# Altium footprint library MH_DA_THU_VIEN_16122016.PcbLib: 531 footprints (part 7 of 34)
Each footprint in its own frame and in the unit in brackets; x right, y up, seen from the top. Pads: shape width x height; smd on the part's side, far side on the other; paste and mask are expansions set on the pad; w line width, h text height; cw(c..) or ccw(c..) is an arc to the next point about the centre after c.
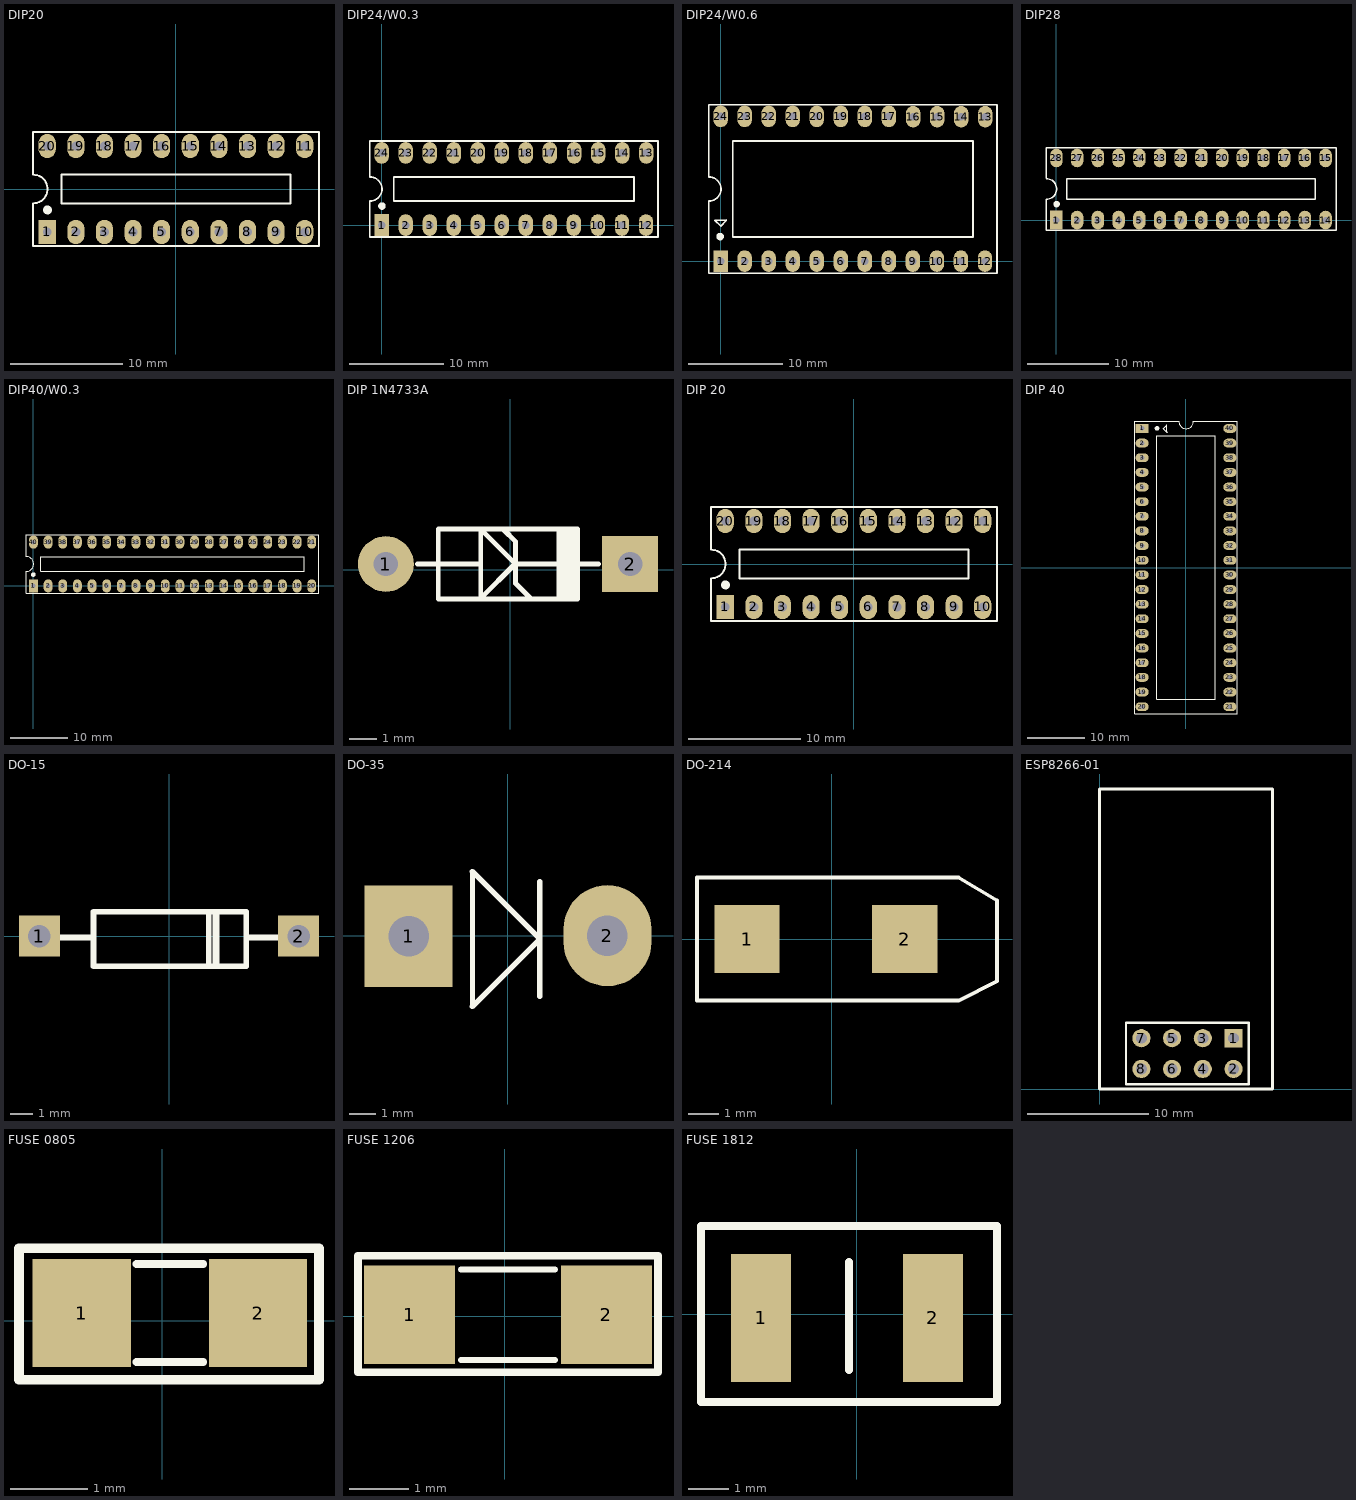
[diagram p6: the footprints below, top view; thin cyan lines are the x and y axes]

## DIP20 [mil]
pads (20):
  rect 60x85 hole 31: 1(-450,-149)
  oval 60x85 hole 31: 2(-350,-149) 3(-250,-149) 4(-150,-149) 5(-50,-149) 6(50,-149) 7(150,-149) 8(250,-149) 9(350,-149) 10(450,-149) 11(450,151) 12(350,151) 13(250,151) 14(150,151) 15(50,151) 16(-50,151) 17(-150,151) 18(-250,151) 19(-350,151) 20(-450,151)
Top Overlay:
  circle w15: c-449,-72 r8
  lines w7: -500.38,-48.95 ccw(c-498.69,1.02) -500,51 ; -500,-49 -500,-199 500,-199 500,201 -500,201 -500,52 ; -400,-49 400,-49 400,51 -400,51 -400,-49
3D body: height 155, standoff -130, extent -541,-167 495,173

## DIP24/W0.3 [mil] "DIP24/W.300, Pin to pin 100mil"
height 100
pads (24):
  rect 60x90 hole 31: 1(0,0)
  oval 60x90 hole 31: 2(100,0) 3(200,0) 4(300,0) 5(400,0) 6(500,0) 7(600,0) 8(700,0) 9(800,0) 10(900,0) 11(1000,0) 12(1100,0) 13(1101,300) 14(1001,300) 15(901,300) 16(801,300) 17(700,300) 18(600,300) 19(500,300) 20(400,300) 21(300,300) 22(200,300) 23(100,300) 24(0,300)
Top Overlay:
  circle w15: c1,79 r8
  lines w7: -50.38,100.05 ccw(c-48.69,150.02) -50,200 ; -50,100 -50,-50 1150,-50 1150,350 -50,350 -50,201 ; 50,100 50,200 1050,200 1050,100 50,100
3D body: height 200, standoff -98.03, extent -89.04,-2.92 1181.04,306.92

## DIP24/W0.6 [mil] "DIP24/W.600, Pin to pin 100mil"
height 100
pads (24):
  rect 60x90 hole 31: 1(0,0)
  oval 60x90 hole 31: 2(100,0) 3(200,0) 4(300,0) 5(400,0) 6(500,0) 7(600,0) 8(700,0) 9(800,0) 10(900,0) 11(1000,0) 12(1100,0) 13(1101,601) 14(1001,601) 15(901,601) 16(801,601) 17(700,602) 18(600,602) 19(500,602) 20(400,602) 21(300,602) 22(200,602) 23(100,602) 24(0,602)
Top Overlay:
  circle w15: c-2,102 r8
  lines w7: -50,350 -50,650 1150,650 1150,-50 -50,-50 -50,250 ccw(c-48.31,299.97) -49.62,349.95 ; -25,170 23,170 24,171 24,169 0,145 0,146 -24,170 -25,170 ; 50,100 50,500 1050,500 1050,100 50,100
3D body: height 227.95, standoff -129.92, extent -82.52,0.16 1202.52,600

## DIP28 [mil] "28 PIN, W 300mil, Pin to pin 100mil"
height 100
pads (28):
  rect 60x90 hole 31: 1(0,0)
  oval 60x90 hole 31: 2(100,0) 3(200,0) 4(300,0) 5(400,0) 6(500,0) 7(600,0) 8(700,0) 9(800,0) 10(900,0) 11(1000,0) 12(1100,0) 13(1200,0) 14(1300,0) 15(1300,300) 16(1200,300) 17(1100,300) 18(1000,300) 19(900,300) 20(800,300) 21(700,300) 22(600,300) 23(500,300) 24(400,300) 25(300,300) 26(200,300) 27(100,300) 28(0,300)
Top Overlay:
  circle w15: c1,77 r8
  lines w7: -50.38,100.05 ccw(c-48.69,150.02) -50,200 ; -50,100 -50,-50 1350,-50 1350,350 -50,350 -50,201 ; 50,100 50,200 1250,200 1250,100 50,100
3D body: height 200, standoff -98.03, extent -50,-10 1367.32,299.84

## DIP40/W0.3 [mil] "40 PIN, W 300mil, Pin to pin 100mil"
height 100
pads (40):
  rect 60x90 hole 31: 1(0,0)
  oval 60x90 hole 31: 2(100,0) 3(200,0) 4(300,0) 5(400,0) 6(500,0) 7(600,0) 8(700,0) 9(800,0) 10(900,0) 11(1000,0) 12(1100,0) 13(1200,0) 14(1300,0) 15(1400,0) 16(1500,0) 17(1600,0) 18(1700,0) 19(1800,0) 20(1900,0) 21(1900,300) 22(1800,300) 23(1700,300) 24(1600,300) 25(1500,300) 26(1400,300) 27(1300,300) 28(1200,300) 29(1100,300) 30(1000,300) 31(900,300) 32(800,300) 33(700,300) 34(600,300) 35(500,300) 36(400,300) 37(300,300) 38(200,300) 39(100,300) 40(0,300)
Top Overlay:
  circle w15: c-1,78 r8
  lines w7: -50.38,100.05 ccw(c-48.69,150.02) -50,200 ; -50,100 -50,-50 1950,-50 1950,350 -50,350 -50,201 ; 50,100 1850,100 1850,200 50,200 50,100
3D body: height 227.95, standoff -129.92, extent -70,-160.91 2000.87,440.91

## DIP 1N4733A [mil]
pads (2):
  round 80 hole 35: 1(-178.07,8.11)
  rect 80x80 hole 35: 2(171.93,8.11)
Top Overlay:
  region: 96.93,-41.89 96.93,58.11 66.93,58.11 66.93,-41.89
  lines w7: -133.07,8.11 -103.07,8.11 -43.07,8.11 ; -9.57,57.61 7.93,40.11 7.93,-19.89 29.93,-41.89 ; 6.93,9.11 6.93,8.11 -42.07,-40.89 -42.07,-41.89 -42.07,58.11 7.43,8.61 ; 11.93,8.11 76.93,8.11 ; 96.93,-12.89 96.93,8.11 ; 96.93,24.11 96.93,8.11 ; 126.93,8.11 96.93,8.11 ; 96.93,8.11 96.93,58.11 -103.07,58.11 -103.07,-41.89 96.93,-41.89 96.93,8.11
3D body: height 120.61, standoff -50, extent -163.07,-31.89 167.93,73.11

## DIP 20 [mil]
pads (20):
  rect 60x85 hole 31: 1(-450,-150)
  oval 60x85 hole 31: 2(-350,-150) 3(-250,-150) 4(-150,-150) 5(-50,-150) 6(50,-150) 7(150,-150) 8(250,-150) 9(350,-150) 10(450,-150) 11(450,150) 12(350,150) 13(250,150) 14(150,150) 15(50,150) 16(-50,150) 17(-150,150) 18(-250,150) 19(-350,150) 20(-450,150)
Top Overlay:
  circle w15: c-449,-73 r8
  lines w7: -500.38,-49.95 ccw(c-498.69,0.02) -500,50 ; -500,-50 -500,-200 500,-200 500,200 -500,200 -500,51 ; -400,-50 -400,50 400,50 400,-50 -400,-50
3D body: height 155, standoff -130, extent -541,-168 495,172

## DIP 40 [mil]
pads (40):
  rect 90x60 hole 31: 1(-300,950)
  oval 90x60 hole 31: 2(-300,850) 3(-300,750) 4(-300,650) 5(-300,550) 6(-300,450) 7(-300,350) 8(-300,250) 9(-300,150) 10(-300,50) 11(-300,-50) 12(-300,-150) 13(-300,-250) 14(-300,-350) 15(-300,-450) 16(-300,-550) 17(-300,-650) 18(-300,-750) 19(-300,-850) 20(-300,-950) 21(300,-950) 22(300,-850) 23(300,-750) 24(300,-650) 25(300,-550) 26(300,-450) 27(300,-350) 28(300,-250) 29(300,-150) 30(300,-50) 31(300,50) 32(300,150) 33(300,250) 34(300,350) 35(300,450) 36(300,550) 37(300,650) 38(300,750) 39(300,850) 40(300,950)
Top Overlay:
  circle w15: c-198,951 r8
  lines w7: -49,1000 -350,1000 -350,-1000 350,-1000 350,1000 52,1000 ; -48.95,1000.38 ccw(c1.02,998.68) 51,1000 ; -200,-900 200,-900 200,900 -200,900 -200,-900 ; -155,949 -131,925 -129,925 -130,926 -130,974 -130,973 -154,949 -155,949
3D body: height 224.41, standoff -101.57, extent -310,-1032.48 299.84,1032.48

## DO-15 [mm]
pads (2):
  rect 1.8x1.8 hole 1: 1(-5.715,0) 2(5.715,0)
Top Overlay:
  lines w0.2: 2.009,-1.333 2.009,1.08 ; 2.136,-1.333 2.136,1.08
  lines w0.254: -5.715,-0.063 -3.325,-0.063 ; 1.755,-1.333 1.755,1.08 ; 3.406,-0.063 5.715,-0.063 ; -3.325,-1.333 -3.325,1.08 3.406,1.08 3.406,-1.333 -3.325,-1.333
3D body: height 2, standoff -5.5, extent -6.724,-2 6.836,2

## DO-35 [mil]
pads (2):
  rect 130x150 hole 60: 1(-147.3,-0.45)
  oval 130x150 hole 60: 2(147.3,0.45)
Top Overlay:
  lines w7: -52.7,-104.55 -52.7,95.45
  lines w8: -52.7,-104.55 47.3,-4.55 -52.7,95.45 ; 47.3,-89.55 47.3,80.45
3D body: height 87.01, standoff -70.87, extent -167.94,-39.31 152.54,40.21

## DO-214 [mil]
pads (2):
  rect 85x89 smd: 1(-110,0) 2(95,0)
Top Overlay:
  lines w5: -175,-80 165,-80 215,-55 215,50 165,80 -175,80 -175,-80
3D body: height 84.69, standoff -1.97, extent -108.43,-53.15 88.42,53.15

## ESP8266-01 [mm]
pads (8):
  rect 1.5x1.5 hole 0.9: 1(11.08,4.2)
  round 1.5 hole 0.9: 2(11.08,1.66) 3(8.54,4.2) 4(8.54,1.66) 5(6,4.2) 6(6,1.66) 7(3.46,4.2) 8(3.46,1.66)
Top Overlay:
  lines w0.2: 2.19,0.39 12.35,0.39 12.35,5.47 2.19,5.47 2.19,0.39
  lines w0.254: 0,0 14.3,0 14.3,24.8 0,24.8 0,0

## FUSE 185F [mm]

## FUSE 0805 [mm]
pads (2):
  rect 1.27x1.397 smd: 1(-1.043,0.1) 2(1.243,0.1)
Top Overlay:
  lines w0.102: -0.332,-0.535 0.532,-0.535 ; -0.332,0.735 0.532,0.735
  lines w0.127: -1.856,-0.764 2.03,-0.764 2.03,0.938 -1.856,0.938 -1.856,-0.764
3D body: height 1.24, standoff 0, extent -1.005,-0.649 1.205,0.849

## FUSE 1206 [mil]
pads (2):
  rect 60x65 smd: 1(-63,0.94) 2(67,0.94)
Top Overlay:
  lines w4: -29,-29.06 33,-29.06 ; -29,30.94 33,30.94
  lines w5: -97,-37.06 -97,39.94 101,39.94 101,-37.06 -97,-37.06
3D body: height 22.09, standoff -0.04, extent -63.02,-32.51 63.04,32.52

## FUSE 1812 [mm]
pads (2):
  rect 1.5x3.2 smd: 1(-2.4,-0.1) 2(1.9,-0.1)
Top Overlay:
  lines w0.2: -0.2,-1.4 -0.2,1.3 ; -3.9,-2.2 3.5,-2.2 3.5,2.2 -3.9,2.2 -3.9,-2.2
3D body: height 1.03, standoff 0, extent -2.565,-1.84 2.17,1.64